# Altium footprint library 集大电协1.5.PcbLib: 273 footprints (part 11 of 18)
Each footprint in its own frame and in the unit in brackets; x right, y up, seen from the top. Pads: shape width x height; smd on the part's side, far side on the other; paste and mask are expansions set on the pad; w line width, h text height; cw(c..) or ccw(c..) is an arc to the next point about the centre after c.
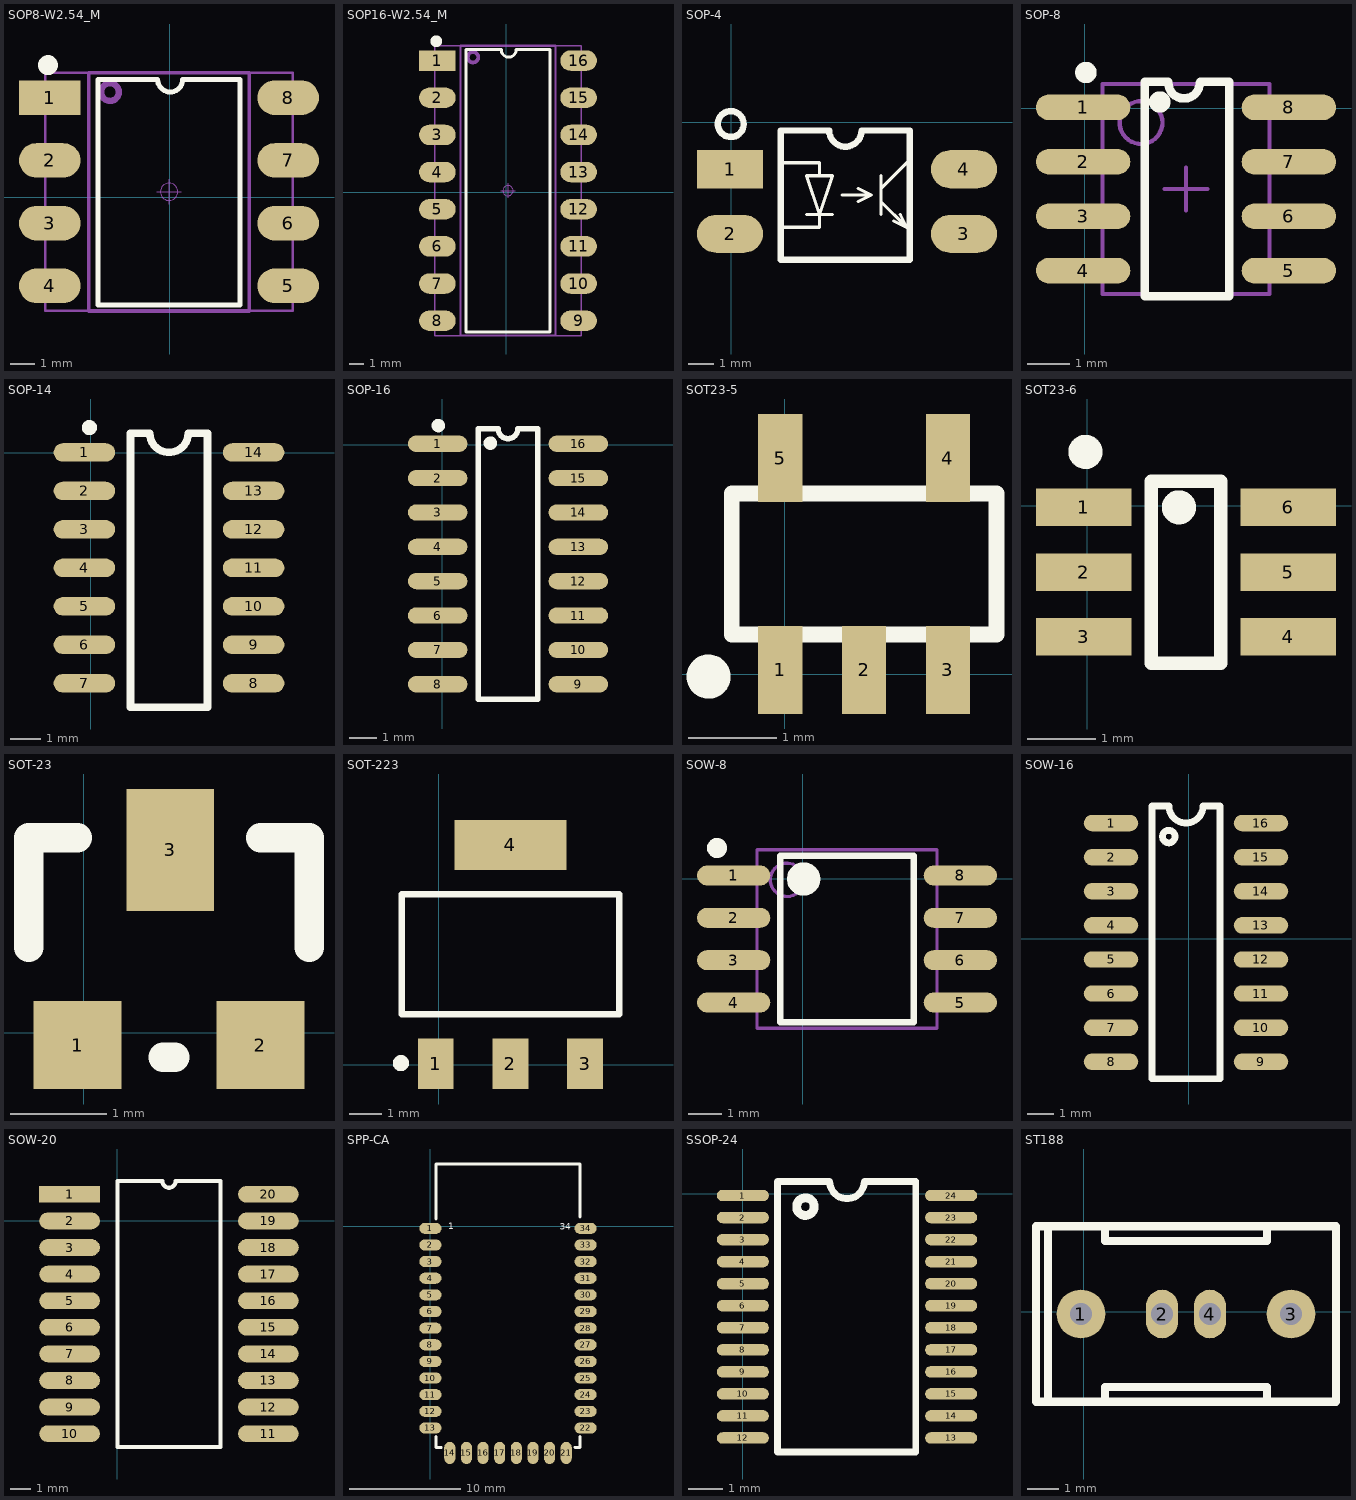
[diagram p10: the footprints below, top view; thin cyan lines are the x and y axes]

## SOP8-W2.54_M [mm]
pads (8):
  rect 2.5x1.4 smd: 1(-4.851,4.039)
  oval 2.5x1.4 smd: 2(-4.851,1.499) 3(-4.851,-1.041) 4(-4.851,-3.581) 5(4.801,-3.581) 6(4.801,-1.041) 7(4.801,1.499) 8(4.801,4.039)
Top Overlay:
  circle w0.5: c-4.93,5.359 r0.155
  lines w0.2: -2.896,4.781 -2.896,-4.363 2.845,-4.363 2.845,4.781
  lines w0.203: -2.896,4.781 -0.485,4.781 ccw(c0.023,4.781) 0.023,4.273 ccw(c0.023,4.781) 0.531,4.781 2.845,4.781
Mechanical 13:
  circle w0.254: c-2.417,4.267 r0.359
  lines w0.15: -3.275,-4.597 3.225,-4.597 3.225,5.055 -3.275,5.055 -3.275,-4.597
Mechanical 15:
  circle w0.05: c-0.025,0.229 r0.35
  lines w0.05: -0.525,0.229 0.475,0.229 ; -0.025,-0.271 -0.025,0.729
  lines w0.1: -5.029,-4.597 4.978,-4.597 4.978,5.055 -5.029,5.055 -5.029,-4.597
3D body "SOP8-W2.54.STEP": height 3.82, standoff -0.03, extent -5.025,-4.601 4.975,5.059

## SOP16-W2.54_M [mm]
pads (16):
  rect 2.5x1.4 smd: 1(-4.699,8.992)
  oval 2.5x1.4 smd: 2(-4.699,6.452) 3(-4.699,3.912) 4(-4.699,1.372) 5(-4.699,-1.168) 6(-4.699,-3.708) 7(-4.699,-6.248) 8(-4.699,-8.788) 9(4.953,-8.788) 10(4.953,-6.248) 11(4.953,-3.708) 12(4.953,-1.168) 13(4.953,1.372) 14(4.953,3.912) 15(4.953,6.452) 16(4.953,8.992)
Top Overlay:
  circle w0.5: c-4.777,10.312 r0.155
  lines w0.2: -2.743,-9.57 2.997,-9.57 2.997,9.734 ; -2.743,-9.55 -2.743,9.734
  lines w0.203: -2.743,9.734 -0.333,9.734 ccw(c0.175,9.734) 0.175,9.226 ccw(c0.175,9.734) 0.683,9.734 2.997,9.734
Mechanical 13:
  circle w0.254: c-2.264,9.22 r0.359
  lines w0.15: -3.123,-9.804 3.377,-9.804 3.377,10.008 -3.123,10.008 -3.123,-9.804
Mechanical 15:
  circle w0.05: c0.127,0.102 r0.35
  lines w0.05: -0.373,0.102 0.627,0.102 ; 0.127,-0.398 0.127,0.602
  lines w0.1: -4.877,-9.804 5.131,-9.804 5.131,10.008 -4.877,10.008 -4.877,-9.804
3D body "SOP16-W2.54.STEP": height 3.82, standoff -0.03, extent -4.873,-9.808 5.127,10.012

## SOP-4 [mm]
pads (4):
  rect 2.6x1.5 smd: 1(-0.05,-1.846)
  oval 2.6x1.5 smd: 2(-0.05,-4.386) 3(9.15,-4.386) 4(9.15,-1.846)
Top Overlay:
  circle w0.254: c-0.022,-0.068 r0.508
  lines w0.127: 1.946,-4.132 3.47,-4.132 3.47,-3.624 ; 1.946,-1.592 3.47,-1.592 3.47,-2.1 ; 2.962,-3.624 3.978,-3.624 ; 4.359,-2.862 5.502,-2.862 ; 4.994,-3.116 5.502,-2.862 ; 4.994,-2.608 5.502,-2.862 ; 5.883,-3.624 5.883,-2.1 ; 5.883,-3.116 6.899,-4.132 ; 5.883,-2.608 6.899,-1.592 ; 6.391,-3.878 6.899,-4.132 ; 6.645,-3.624 6.899,-4.132 ; 3.47,-3.624 3.978,-2.1 2.962,-2.1 3.47,-3.624
  lines w0.254: 1.946,-5.402 7.026,-5.402 7.026,-0.322 5.121,-0.322 cw(c4.486,-0.322) 3.851,-0.322 1.946,-0.322 1.946,-5.402
3D body "User Library-SOP254P665X290.STEP": height 2.9, standoff 0, extent 1.164,-5.4 7.85,-0.45

## SOP-8 [mm]
pads (8):
  oval 2.2x0.6 smd: 1(-0.038,0.025) 2(-0.038,-1.245) 3(-0.038,-2.515) 4(-0.038,-3.785) 5(4.762,-3.785) 6(4.762,-2.515) 7(4.762,-1.245) 8(4.762,0.025)
Top Overlay:
  circle w0.25: c1.75,0.15 r0.125
  circle w0.25: c0.025,0.838 r0.125
  lines w0.2: 1.95,0.6 ccw(c2.317,0.6) 2.683,0.6 ; 1.95,0.62 1.4,0.62 1.4,-4.38 3.375,-4.38 3.375,0.62 2.7,0.62
Mechanical 13:
  circle w0.1: c1.312,-0.33 r0.5
  lines w0.1: 0.412,-4.33 0.412,0.57 4.312,0.57 4.312,-4.33 0.412,-4.33
Mechanical 15:
  lines w0.1: 1.862,-1.88 2.862,-1.88 ; 2.362,-2.38 2.362,-1.38
3D body "SOP-8.STEP": height 1.7, standoff 0, extent -0.625,-4.325 5.375,0.575

## SOP-14 [mil]
pads (14):
  oval 80x24 smd: 1(-8.54,0.68) 2(-8.54,-49.32) 3(-8.54,-99.32) 4(-8.54,-149.32) 5(-8.54,-199.32) 6(-8.54,-249.32) 7(-8.54,-299.32) 8(211.46,-299.32) 9(211.46,-249.32) 10(211.46,-199.32) 11(211.46,-149.32) 12(211.46,-99.32) 13(211.46,-49.32) 14(211.46,0.68)
Top Overlay:
  circle w9.84: c-2,33 r4.92
  lines w10: 51.46,-330.71 51.46,25.68 76.46,25.68 ccw(c101.46,25.68) 126.46,25.68 151.46,25.68 151.46,-330.71 51.46,-330.71
3D body "User Library-SOP14-p127-780.STEP": height 43.31, standoff 0, extent -43.31,-349.41 244.09,52.16

## SOP-16 [mm]
pads (16):
  oval 2.2x0.6 smd: 1(-0.174,0.028) 2(-0.174,-1.242) 3(-0.174,-2.512) 4(-0.174,-3.782) 5(-0.174,-5.052) 6(-0.174,-6.322) 7(-0.174,-7.592) 8(-0.174,-8.862) 9(5.026,-8.862) 10(5.026,-7.592) 11(5.026,-6.322) 12(5.026,-5.052) 13(5.026,-3.782) 14(5.026,-2.512) 15(5.026,-1.242) 16(5.026,0.028)
Top Overlay:
  circle w0.25: c1.775,0.05 r0.125
  circle w0.25: c-0.15,0.7 r0.125
  lines w0.2: 1.326,-9.417 1.326,0.583 2.059,0.583 ccw(c2.426,0.583) 2.793,0.583 3.526,0.583 3.526,-9.417 1.326,-9.417
3D body "SOP-16.STEP": height 1.4, standoff 0, extent -0.45,-9.4 5.55,0.5

## SOT23-5 [mm]
pads (5):
  rect 0.5x1 smd: 1(-0.051,0.051) 2(0.899,0.051) 3(1.849,0.051) 4(1.849,2.451) 5(-0.051,2.451)
Top Overlay:
  circle w0.25: c-0.864,-0.025 r0.125
  lines w0.178: -0.601,0.451 2.399,0.451 2.399,2.051 -0.601,2.051 -0.601,0.451
3D body "User Library-SOT23-5.STEP": height 1.09, standoff -0.01, extent -0.551,-0.15 2.349,2.65

## SOT23-6 [mm]
pads (6):
  rect 1.4x0.55 smd: 1(-0.051,-0.025) 2(-0.051,-0.975) 3(-0.051,-1.925) 4(2.949,-1.925) 5(2.949,-0.975) 6(2.949,-0.025)
Top Overlay:
  circle w0.25: c1.346,-0.025 r0.125
  circle w0.25: c-0.025,0.787 r0.125
  lines w0.2: 0.941,-2.311 1.957,-2.311 1.957,0.356 0.941,0.356 0.941,-2.311
3D body "SOT23-6.STEP": height 1.15, standoff -0.03, extent 0.07,-2.467 2.877,0.533

## SOT-23 [mil]
pads (3):
  rect 36x36 smd: 1(-2.52,-5.16) 2(72.48,-5.16)
  rect 36x50 smd: 3(35.48,74.84)
Top Overlay:
  lines w12: -22.52,34.84 -22.52,79.84 -2.52,79.84 ; 32.48,-10.16 37.48,-10.16 ; 72.48,79.84 92.48,79.84 92.48,34.84
3D body "SOT-23-3.STEP": height 47.24, standoff 0, extent -22.08,-18.11 92.09,92.12

## SOT-223 [mm]
pads (4):
  rect 1.1x1.55 smd: 1(-0.09,0.029) 2(2.21,0.029) 3(4.51,0.029)
  rect 3.45x1.55 smd: 4(2.21,6.779)
Top Overlay:
  circle w0.25: c-1.166,0.051 r0.125
  lines w0.2: -1.14,1.554 -1.14,5.254 5.56,5.254 5.56,1.554 -1.14,1.554
3D body: height 0.8, standoff 0, extent -1.092,1.372 5.512,5.563
3D body: height 0.3, standoff 0, extent 0.559,5.563 3.861,6.833
3D body: height 0.3, standoff 0, extent -0.584,-0.533 0.305,1.372
3D body: height 0.3, standoff 0, extent 1.702,-0.533 2.591,1.372
3D body: height 0.3, standoff 0, extent 4.115,-0.533 5.004,1.372

## SOW-8 [mm]
pads (8):
  oval 2.2x0.6 smd: 1(-2.078,0.092) 2(-2.078,-1.178) 3(-2.078,-2.448) 4(-2.078,-3.718) 5(4.722,-3.718) 6(4.722,-2.448) 7(4.722,-1.178) 8(4.722,0.092)
Top Overlay:
  circle w0.3: c-2.578,0.917 r0.15
  circle w0.5: c0.022,-0.013 r0.25
  lines w0.2: -0.678,-4.313 3.322,-4.313 3.322,0.687 -0.678,0.687 -0.678,-4.313
Mechanical 13:
  circle w0.1: c-0.478,-0.038 r0.5
  lines w0.1: -1.378,-4.488 4.022,-4.488 4.022,0.862 -1.378,0.862 -1.378,-4.488
3D body "User Library-sop-8.STEP": height 1.6, standoff 0, extent -1.724,-4.349 4.318,0.671

## SOW-16 [mil]
pads (16):
  oval 80x24 smd: 1(-113.69,169.78) 2(-113.69,119.78) 3(-113.69,69.78) 4(-113.69,19.78) 5(-113.69,-30.22) 6(-113.69,-80.22) 7(-113.69,-130.22) 8(-113.69,-180.22) 9(106.31,-180.22) 10(106.31,-130.22) 11(106.31,-80.22) 12(106.31,-30.22) 13(106.31,19.78) 14(106.31,69.78) 15(106.31,119.78) 16(106.31,169.78)
Top Overlay:
  circle w10: c-29,150 r9.22
  lines w10: -53.69,-205.22 46.31,-205.22 46.31,194.78 21.31,194.78 cw(c-3.69,194.78) -28.69,194.78 -53.69,194.78 -53.69,-205.22
3D body "SOP-16.STEP": height 55.12, standoff 0, extent -122.1,-199.88 114.12,189.89

## SOW-20 [mm]
pads (20):
  rect 2.9x0.8 smd: 1(-2.286,1.27)
  oval 2.9x0.8 smd: 2(-2.286,0) 3(-2.286,-1.27) 4(-2.286,-2.54) 5(-2.286,-3.81) 6(-2.286,-5.08) 7(-2.286,-6.35) 8(-2.286,-7.62) 9(-2.286,-8.89) 10(-2.286,-10.16) 11(7.214,-10.16) 12(7.214,-8.89) 13(7.214,-7.62) 14(7.214,-6.35) 15(7.214,-5.08) 16(7.214,-3.81) 17(7.214,-2.54) 18(7.214,-1.27) 19(7.214,0) 20(7.214,1.27)
Top Overlay:
  lines w0.2: -0.001,-10.795 4.929,-10.795 4.929,1.905 2.781,1.905 cw(c2.464,1.905) 2.146,1.905 -0.001,1.905 -0.001,-10.795
3D body: height 2.67, standoff 2.54, extent -0.634,-0.635 0.635,0.635
3D body: height 2.54, standoff 0, extent -2.349,-10.477 7.493,1.715

## SPP-CA [mm]
pads (34):
  oval 2x1 smd: 1(0.013,-0.174) 2(0.013,-1.674) 3(0.013,-3.174) 4(0.013,-4.674) 5(0.013,-6.174) 6(0.013,-7.674) 7(0.013,-9.174) 8(0.013,-10.674) 9(0.013,-12.174) 10(0.013,-13.674) 11(0.013,-15.174) 12(0.013,-16.674) 13(0.013,-18.174) 22(14.013,-18.174) 23(14.013,-16.674) 24(14.013,-15.174) 25(14.013,-13.674) 26(14.013,-12.174) 27(14.013,-10.674) 28(14.013,-9.174) 29(14.013,-7.674) 30(14.013,-6.174) 31(14.013,-4.674) 32(14.013,-3.174) 33(14.013,-1.674) 34(14.013,-0.174)
  oval 1x2 smd: 14(1.763,-20.424) 15(3.263,-20.424) 16(4.763,-20.424) 17(6.263,-20.424) 18(7.763,-20.424) 19(9.263,-20.424) 20(10.763,-20.424) 21(12.263,-20.424)
Top Overlay:
  lines w0.254: 0.513,0.652 0.513,5.623 10.934,5.623 13.513,5.623 13.513,0.855 ; 0.52,-18.957 0.513,-18.964 0.513,-19.924 1.002,-19.924 ; 13.067,-19.922 13.069,-19.924 13.513,-19.924 ; 13.513,-19.897 13.513,-18.932
  text "1" at 1.637,-0.491 h1
  text "34" at 11.67,-0.542 h1

## SSOP-24 [mm]
pads (24):
  oval 1.5x0.33 smd: 1(0,-0.057) 2(0,-0.692) 3(0,-1.327) 4(0,-1.962) 5(0,-2.597) 6(0,-3.232) 7(0,-3.867) 8(0,-4.502) 9(0,-5.137) 10(0,-5.772) 11(0,-6.407) 12(0,-7.042) 13(6,-7.042) 14(6,-6.407) 15(6,-5.772) 16(6,-5.137) 17(6,-4.502) 18(6,-3.867) 19(6,-3.232) 20(6,-2.597) 21(6,-1.962) 22(6,-1.327) 23(6,-0.692) 24(6,-0.057)
Top Overlay:
  circle w0.254: c1.803,-0.378 r0.254
  lines w0.2: 0.993,-7.45 4.981,-7.45 4.981,0.35 3.5,0.35 cw(c3,0.35) 2.5,0.35 0.993,0.35 0.993,-7.45
3D body: height 2.27, standoff 0.37, extent -0.975,-7.825 6.925,0.575

## ST188 [mm]
pads (4):
  round 1.524 hole 0.7: 1(-0.084,-0.07) 3(6.496,-0.07)
  oval 1x1.524 hole 0.7: 2(2.456,-0.07) 4(3.956,-0.07)
Top Overlay:
  lines w0.254: -1.112,-2.82 -1.112,2.68 ; 0.666,-2.82 0.666,-2.356 5.746,-2.356 5.746,-2.82 ; 0.666,2.68 0.666,2.216 5.746,2.216 5.746,2.68 ; -1.494,-2.82 7.906,-2.82 7.906,2.68 -1.494,2.68 -1.494,-2.82
3D body "User Library-ST 188.step": height 8.2, standoff -15.05, extent -1.249,-2.489 7.751,2.511